# Altium footprint library Conectori.PcbLib: 65 footprints (part 1 of 5)
Each footprint in its own frame and in the unit in brackets; x right, y up, seen from the top. Pads: shape width x height; smd on the part's side, far side on the other; paste and mask are expansions set on the pad; w line width, h text height; cw(c..) or ccw(c..) is an arc to the next point about the centre after c.
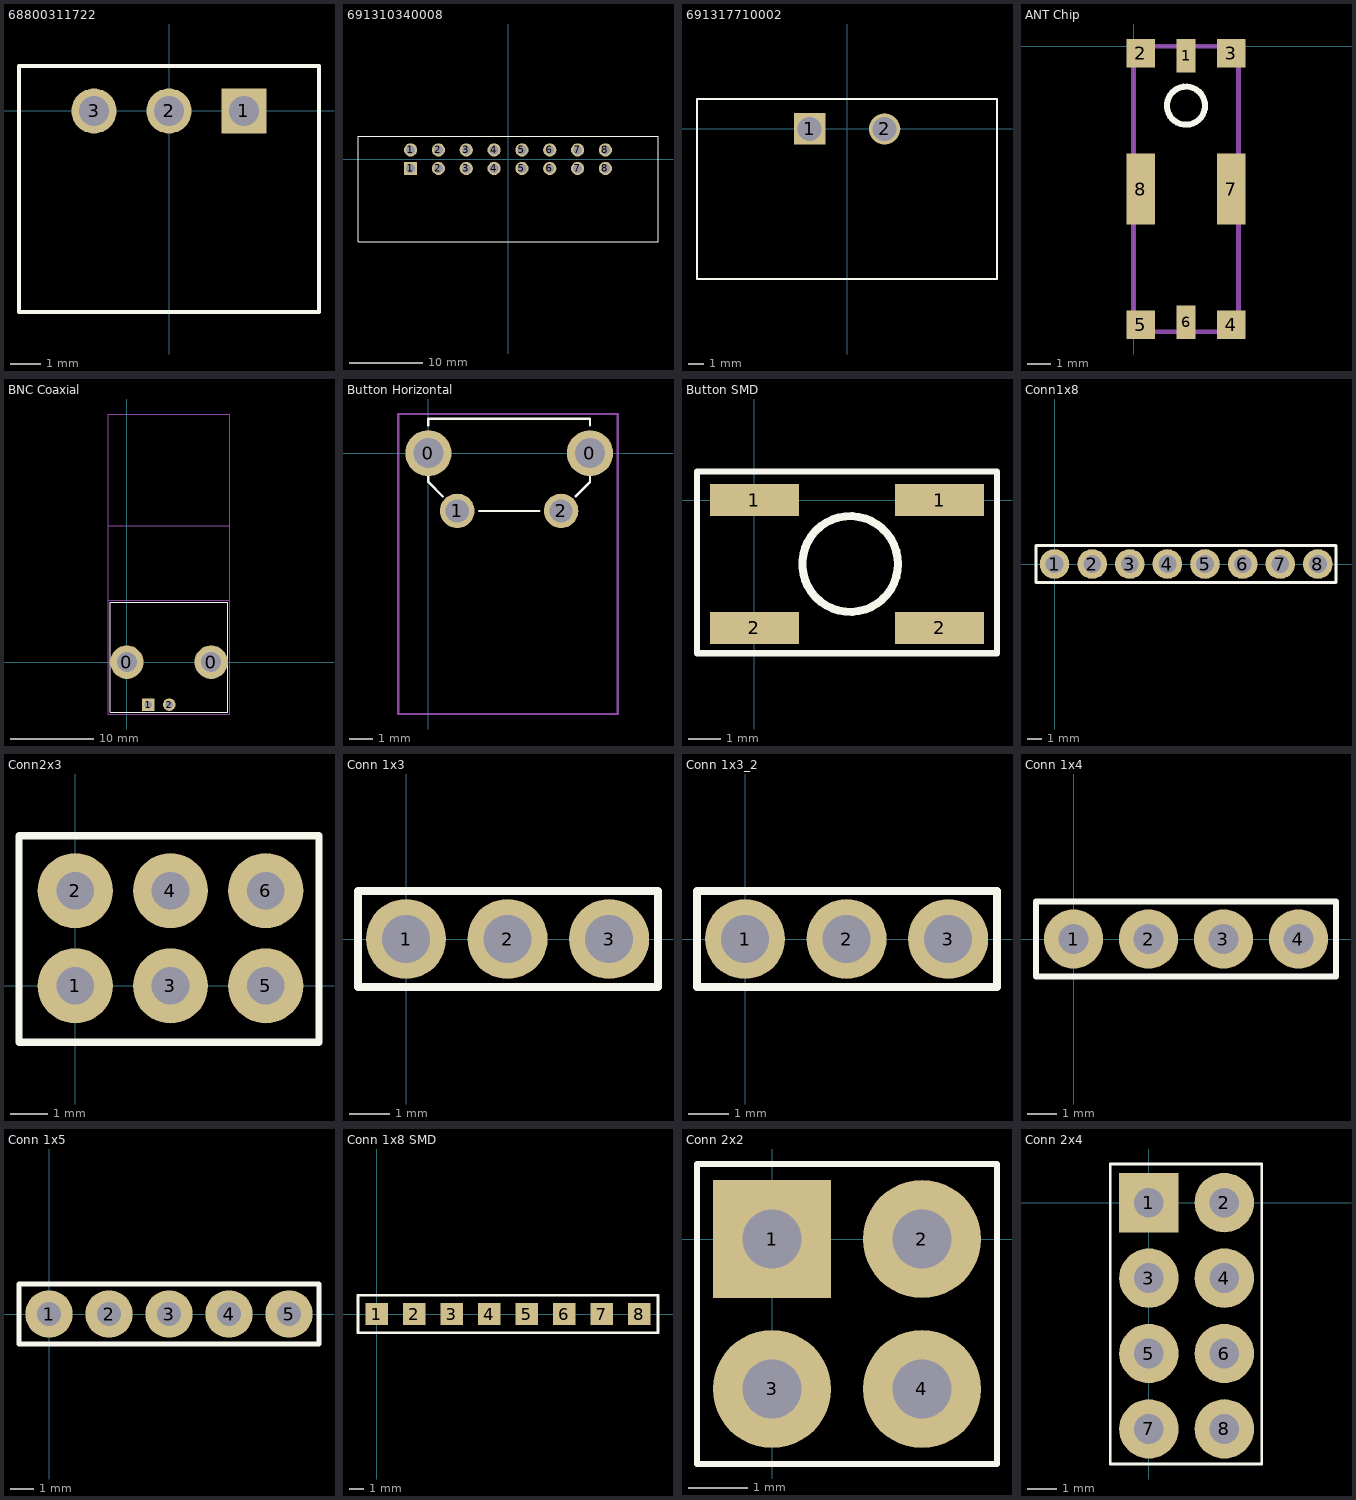
[diagram p0: the footprints below, top view; thin cyan lines are the x and y axes]

## 68800311722 [mm] "3 pins, right angle"
height 4.2
pads (3):
  rect 1.5x1.5 hole 1: 1(2.5,0)
  round 1.5 hole 1: 2(0,0) 3(-2.5,0)
Top Overlay:
  lines w0.127: -5,-6.7 -5,1.5 5,1.5 5,-6.7 -5,-6.7
3D body "68800311722.stp": height 4.21, standoff -3.38, extent -5,-6.683 5,1.517

## 691310340008 [mm] "Serie 3103 - 3.81 mm _ 8 pins"
height 6.8
pads (16):
  rect 1.8x1.8 hole 1.2: 1(-13.335,-1.27)
  round 1.8 hole 1.2: 1(-13.335,1.27) 2(-9.525,-1.27) 2(-9.525,1.27) 3(-5.715,-1.27) 3(-5.715,1.27) 4(-1.905,-1.27) 4(-1.905,1.27) 5(1.905,-1.27) 5(1.905,1.27) 6(5.715,-1.27) 6(5.715,1.27) 7(9.525,-1.27) 7(9.525,1.27) 8(13.335,-1.27) 8(13.335,1.27)
Top Overlay:
  lines w0.127: -20.535,-11.33 20.535,-11.33 20.535,3.17 -20.535,3.17 -20.535,-11.33
3D body "691310340008.stp": height 6.9, standoff -3.3, extent -20.47,-11.4 20.6,3.1

## 691317710002 [mm] "5.00mm - Closed Horizhontal PCB Header with Flanges - 02p"
height 8.5
pads (2):
  rect 2.1x2.1 hole 1.6: 1(-2.5,0)
  round 2.1 hole 1.6: 2(2.5,0)
Top Overlay:
  lines w0.127: -10,-10 10,-10 10,2 -10,2 -10,-10
3D body "691317710002.stp": height 8.56, standoff -3.94, extent -10,-10 10,2

## ANT Chip [mm]
height 1.2
pads (8):
  rect 0.8x1.4 smd: 1(2.2,-0.4) 6(2.2,-11.6)
  rect 1.2x1.2 smd: 2(0.3,-0.3) 3(4.1,-0.3) 4(4.1,-11.7) 5(0.3,-11.7)
  rect 1.2x3 smd: 7(4.1,-6) 8(0.3,-6)
Top Overlay:
  circle w0.254: c2.2,-2.5 r0.8
Mechanical 15:
  lines w0.2: 0,-12 4.4,-12 4.4,0 0,0 0,-12
3D body: height 1.3, standoff 1.2, extent 1.412,-3.197 2.906,-1.7
3D body: height 1.2, standoff 0, extent 0,-12 4.4,0
3D body: height 1.2, standoff 0.1, extent 0,-7.5 0.9,-4.5
3D body: height 1.2, standoff 0.1, extent 3.5,-7.5 4.4,-4.5
3D body: height 1.2, standoff 0.1, extent 3.5,-12 4.4,-11.1
3D body: height 1.2, standoff 0.1, extent 1.8,-12 2.6,-10.9
3D body: height 1.2, standoff 0.1, extent 0,-12 0.9,-11.1

## BNC Coaxial [mm]
height 15.6
pads (4):
  round 4 hole 2.4: 0(0,0) 0(10.1,0)
  rect 1.5x1.5 hole 0.9: 1(2.54,-5.08)
  round 1.5 hole 0.9: 2(5.08,-5.08)
Top Overlay:
  lines w0.1: -2,-6 -2,7.2 12.1,7.2 12.1,0.2 12.1,-6 12,-6 -2,-6
Mechanical 15:
  lines w0.1: -2.2,7.4 12.3,7.4 ; -2.2,16.3 12.3,16.3 ; -2.2,-6.2 12.3,-6.2 12.3,29.7 -2.2,29.7 -2.2,-6.2
3D body "User Library-BNC84CT-9000.step": height 15.25, standoff -4.5, extent -0.4,-5.6 10.6,26.4

## Button Horizontal [mm]
height 7
pads (4):
  round 2 hole 1.3: 0(0,0) 0(7,0)
  round 1.5 hole 1: 1(1.25,-2.5) 2(5.75,-2.5)
Top Overlay:
  lines w0.1: 0,-1 0,-1.25 0.625,-1.875 ; 0,1.2 0,1.5 7,1.5 7,1.2 ; 2.2,-2.5 4.8,-2.5 ; 6.375,-1.875 7,-1.25 7,-1
Mechanical 15:
  lines w0.1: -1.3,-11.3 -1.3,1.7 8.2,1.7 8.2,-2.1 8.2,-11.3 -1.1,-11.3 -1.3,-11.3
3D body "User Library-SWITCH  TACTILE  RIGHT ANGLE  12VDC  50MA  8_35MM ACTUATOR  WEALTH METAL TC-0240Z.step": height 7, standoff -4, extent -0.2,-11.05 7.2,1.45

## Button SMD [mm]
height 3.3
pads (4):
  rect 2.8x1 smd: 1(0,0) 1(5.8,0) 2(0,-4) 2(5.8,-4)
Top Overlay:
  circle w0.254: c3,-2 r1.5
  lines w0.2: -1.8,-4.8 -1.8,0.9 -1.7,0.9 7.6,0.9 7.6,-0.4 7.6,-4.8 -1.8,-4.8
3D body "User Library-PTS645SL50SMTR92-LFS.STEP": height 5, standoff 0, extent -1.5,-4.9 7.5,1.1

## Conn1x8 [mm]
height 10
pads (8):
  round 2 hole 1.2: 1(0,0) 2(2.54,0) 3(5.08,0) 4(7.62,0) 5(10.16,0) 6(12.7,0) 7(15.24,0) 8(17.78,0)
Top Overlay:
  lines w0.2: -1.25,-1.25 -1.25,1.25 19,1.25 19,0 19,-1.25 -1.25,-1.25
3D body "4191.stp": height 10.64, standoff -3.58, extent -1.133,-1.18 18.933,1.157

## Conn2x3 [mm]
pads (6):
  round 2 hole 1: 1(0,0) 2(0,2.54) 3(2.54,0) 4(2.54,2.54) 5(5.08,0) 6(5.08,2.54)
Top Overlay:
  lines w0.2: -1.5,-1.5 -1.5,4 6.5,4 6.5,-1.5 -1.5,-1.5
3D body: height 5, standoff 0, extent -1.625,-1.625 6.625,4.125
3D body: height 5, standoff 0, extent -0.496,2.041 0.5,3.039
3D body: height 5, standoff 0, extent 2.044,2.041 3.04,3.039
3D body: height 5, standoff 0, extent 2.044,2.041 3.04,3.039
3D body: height 5, standoff 0, extent 4.584,2.041 5.58,3.039
3D body: height 5, standoff 0, extent -0.496,-0.499 0.5,0.499
3D body: height 5, standoff 0, extent 2.044,-0.499 3.04,0.499
3D body: height 5, standoff 0, extent 4.584,-0.499 5.58,0.499

## Conn 1x3 [mm]
height 10
pads (3):
  round 2 hole 1.2: 1(0,0) 2(2.54,0) 3(5.08,0)
Top Overlay:
  lines w0.2: -1.2,-1.2 -1.2,1.2 6.3,1.2 6.3,-1.2 -1.2,-1.2
3D body "User Library-RM254_3pin.step": height 6.22, standoff -2.9, extent -1.275,-1.275 6.345,1.265

## Conn 1x3_2 [mm]
height 10
pads (3):
  round 2 hole 1.2: 1(0,0) 2(2.54,0) 3(5.08,0)
Top Overlay:
  lines w0.2: -1.2,-1.2 -1.2,1.2 6.3,1.2 6.3,-1.2 -1.2,-1.2
3D body "User Library-Header_Male_3Pin.STEP": height 8.74, standoff -2.8, extent -1.27,-1.27 6.35,1.22

## Conn 1x4 [mm]
pads (4):
  round 2 hole 1: 1(0,0) 2(2.54,0) 3(5.08,0) 4(7.62,0)
Top Overlay:
  lines w0.2: -1.27,-1.27 8.89,-1.27 8.89,1.27 -1.27,1.27 -1.27,-1.27
3D body "User Library-Header_Male_4Pin.STEP": height 8.54, standoff -3, extent -1.27,-1.22 8.89,1.27

## Conn 1x5 [mm]
pads (5):
  round 2 hole 1: 1(0,0) 2(2.54,0) 3(5.08,0) 4(7.62,0) 5(10.16,0)
Top Overlay:
  lines w0.2: -1.27,-1.27 -1.27,1.27 11.43,1.27 11.43,-1.27 -1.27,-1.27
3D body "CircuitWorks-HEADER 2_54 VERTICAL 5X.step": height 8.55, standoff -2.45, extent -1.27,-1.27 11.43,1.23

## Conn 1x8 SMD [mm]
pads (8):
  rect 1.5x1.5 smd: 1(0,0) 2(2.54,0) 3(5.08,0) 4(7.62,0) 5(10.16,0) 6(12.7,0) 7(15.24,0) 8(17.78,0)
Top Overlay:
  lines w0.2: -1.27,-1.27 -1.27,1.27 19.05,1.27 19.05,-1.27 -1.27,-1.27
3D body "User Library-Header_Male_8Pin.STEP": height 8.54, standoff -3, extent -1.27,-1.245 19.05,1.245

## Conn 2x2 [mm]
pads (4):
  rect 2x2 hole 1: 1(0,0)
  round 2 hole 1: 2(2.54,0) 3(0,-2.54) 4(2.54,-2.54)
Top Overlay:
  lines w0.1: -1.27,-3.81 -1.27,1.27 3.81,1.27 3.81,-3.81 -1.27,-3.81

## Conn 2x4 [mm]
pads (8):
  rect 2x2 hole 1: 1(0,0)
  round 2 hole 1: 2(2.54,0) 3(0,-2.54) 4(2.54,-2.54) 5(0,-5.08) 6(2.54,-5.08) 7(0,-7.62) 8(2.54,-7.62)
Top Overlay:
  lines w0.1: -1.3,-8.8 -1.3,1.3 3.8,1.3 3.8,-8.8 -1.2,-8.8 -1.3,-8.8